# Altium footprint library ref-packages.PCBLIB: 1544 footprints (part 18 of 103)
Each footprint in its own frame and in the unit in brackets; x right, y up, seen from the top. Pads: shape width x height; smd on the part's side, far side on the other; paste and mask are expansions set on the pad; w line width, h text height; cw(c..) or ccw(c..) is an arc to the next point about the centre after c.
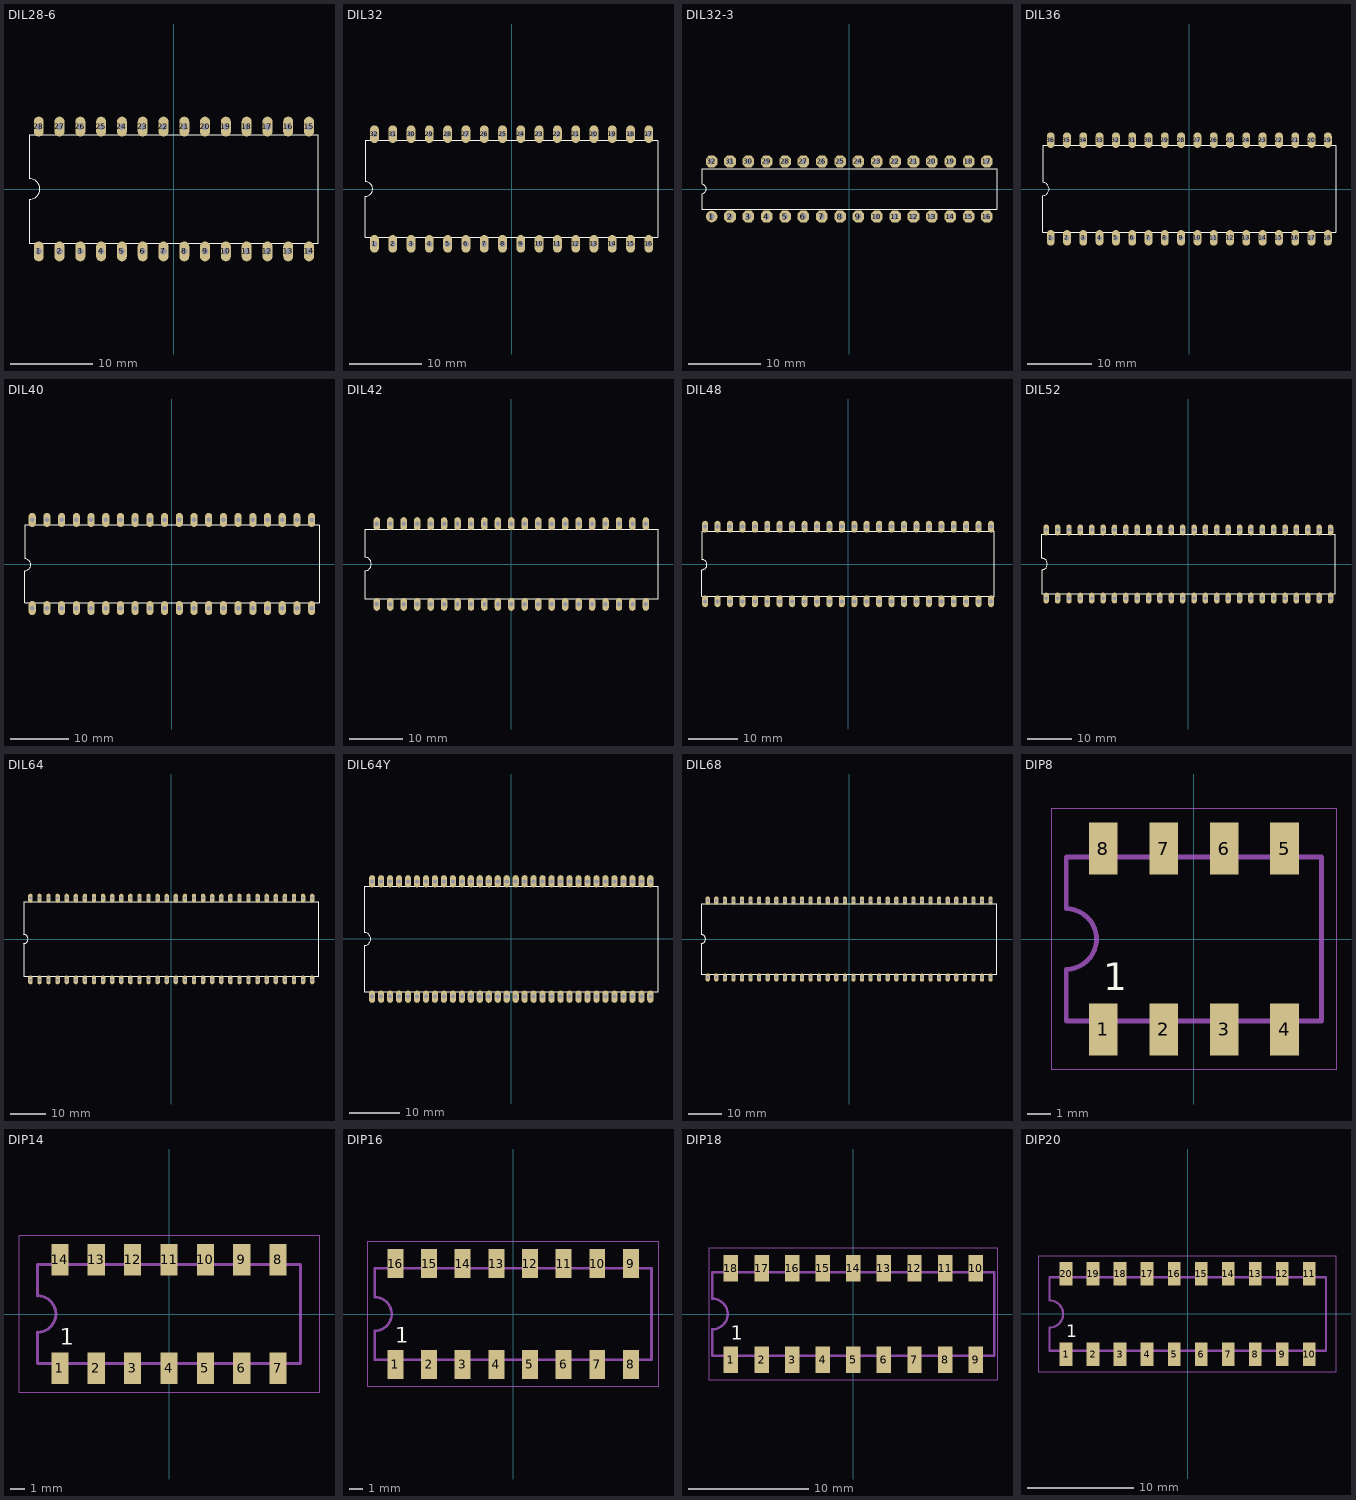
[diagram p17: the footprints below, top view; thin cyan lines are the x and y axes]

## DIL28-6 [mil]
pads (28):
  oval 48x96 hole 32: 1(-650,-300) 2(-550,-300) 3(-450,-300) 4(-350,-300) 5(-250,-300) 6(-150,-300) 7(-50,-300) 8(50,-300) 9(150,-300) 10(250,-300) 11(350,-300) 12(450,-300) 13(550,-300) 14(650,-300) 15(650,300) 16(550,300) 17(450,300) 18(350,300) 19(250,300) 20(150,300) 21(50,300) 22(-50,300) 23(-150,300) 24(-250,300) 25(-350,300) 26(-450,300) 27(-550,300) 28(-650,300)
Top Overlay:
  lines w6: -695,-260 -695,-50 ccw(c-695,0) -695,50 -695,260 695,260 695,-260 -695,-260

## DIL32 [mil]
pads (32):
  oval 48x96 hole 32: 1(-750,-300) 2(-650,-300) 3(-550,-300) 4(-450,-300) 5(-350,-300) 6(-250,-300) 7(-150,-300) 8(-50,-300) 9(50,-300) 10(150,-300) 11(250,-300) 12(350,-300) 13(450,-300) 14(550,-300) 15(650,-300) 16(750,-300) 17(750,300) 18(650,300) 19(550,300) 20(450,300) 21(350,300) 22(250,300) 23(150,300) 24(50,300) 25(-50,300) 26(-150,300) 27(-250,300) 28(-350,300) 29(-450,300) 30(-550,300) 31(-650,300) 32(-750,300)
Top Overlay:
  lines w6: -800,-265 800,-265 800,265 -800,265 -800,40 cw(c-800,0) -800,-40 -800,-265

## DIL32-3 [mil]
pads (32):
  round 63 hole 32: 1(-750,-150)
  oct 63x63 hole 32: 2(-650,-150) 3(-550,-150) 4(-450,-150) 5(-350,-150) 6(-250,-150) 7(-150,-150) 8(-50,-150) 9(50,-150) 10(150,-150) 11(250,-150) 12(350,-150) 13(450,-150) 14(550,-150) 15(650,-150) 16(750,-150) 17(750,150) 18(650,150) 19(550,150) 20(450,150) 21(350,150) 22(250,150) 23(150,150) 24(50,150) 25(-50,150) 26(-150,150) 27(-250,150) 28(-350,150) 29(-450,150) 30(-550,150) 31(-650,150) 32(-750,150)
Top Overlay:
  lines w6: -805,-110 -805,-25 ccw(c-805,0) -805,25 -805,110 805,110 805,-110 -805,-110

## DIL36 [mil]
pads (36):
  oval 48x96 hole 32: 1(-850,-300) 2(-750,-300) 3(-650,-300) 4(-550,-300) 5(-450,-300) 6(-350,-300) 7(-250,-300) 8(-150,-300) 9(-50,-300) 10(50,-300) 11(150,-300) 12(250,-300) 13(350,-300) 14(450,-300) 15(550,-300) 16(650,-300) 17(750,-300) 18(850,-300) 19(850,300) 20(750,300) 21(650,300) 22(550,300) 23(450,300) 24(350,300) 25(250,300) 26(150,300) 27(50,300) 28(-50,300) 29(-150,300) 30(-250,300) 31(-350,300) 32(-450,300) 33(-550,300) 34(-650,300) 35(-750,300) 36(-850,300)
Top Overlay:
  lines w6: -900,-265 900,-265 900,265 -900,265 -900,40 cw(c-900,0) -900,-40 -900,-265

## DIL40 [mil]
pads (40):
  oval 48x96 hole 32: 1(-950,-300) 2(-850,-300) 3(-750,-300) 4(-650,-300) 5(-550,-300) 6(-450,-300) 7(-350,-300) 8(-250,-300) 9(-150,-300) 10(-50,-300) 11(50,-300) 12(150,-300) 13(250,-300) 14(350,-300) 15(450,-300) 16(550,-300) 17(650,-300) 18(750,-300) 19(850,-300) 20(950,-300) 21(950,300) 22(850,300) 23(750,300) 24(650,300) 25(550,300) 26(450,300) 27(350,300) 28(250,300) 29(150,300) 30(50,300) 31(-50,300) 32(-150,300) 33(-250,300) 34(-350,300) 35(-450,300) 36(-550,300) 37(-650,300) 38(-750,300) 39(-850,300) 40(-950,300)
Top Overlay:
  lines w6: -1000,-265 1000,-265 1000,265 -1000,265 -1000,35 cw(c-1000,-5) -1000,-45 -1000,-265

## DIL42 [mil]
pads (42):
  oval 48x96 hole 32: 1(-1000,-300) 2(-900,-300) 3(-800,-300) 4(-700,-300) 5(-600,-300) 6(-500,-300) 7(-400,-300) 8(-300,-300) 9(-200,-300) 10(-100,-300) 11(0,-300) 12(100,-300) 13(200,-300) 14(300,-300) 15(400,-300) 16(500,-300) 17(600,-300) 18(700,-300) 19(800,-300) 20(900,-300) 21(1000,-300) 22(1000,300) 23(900,300) 24(800,300) 25(700,300) 26(600,300) 27(500,300) 28(400,300) 29(300,300) 30(200,300) 31(100,300) 32(0,300) 33(-100,300) 34(-200,300) 35(-300,300) 36(-400,300) 37(-500,300) 38(-600,300) 39(-700,300) 40(-800,300) 41(-900,300) 42(-1000,300)
Top Overlay:
  lines w6: -1090,-260 -1090,-50 ccw(c-1090,0) -1090,50 -1090,260 1090,260 1090,-260 -1090,-260

## DIL48 [mil]
pads (48):
  oval 48x96 hole 32: 1(-1150,-300) 2(-1050,-300) 3(-950,-300) 4(-850,-300) 5(-750,-300) 6(-650,-300) 7(-550,-300) 8(-450,-300) 9(-350,-300) 10(-250,-300) 11(-150,-300) 12(-50,-300) 13(50,-300) 14(150,-300) 15(250,-300) 16(350,-300) 17(450,-300) 18(550,-300) 19(650,-300) 20(750,-300) 21(850,-300) 22(950,-300) 23(1050,-300) 24(1150,-300) 25(1150,300) 26(1050,300) 27(950,300) 28(850,300) 29(750,300) 30(650,300) 31(550,300) 32(450,300) 33(350,300) 34(250,300) 35(150,300) 36(50,300) 37(-50,300) 38(-150,300) 39(-250,300) 40(-350,300) 41(-450,300) 42(-550,300) 43(-650,300) 44(-750,300) 45(-850,300) 46(-950,300) 47(-1050,300) 48(-1150,300)
Top Overlay:
  lines w6: -1175,-260 1175,-260 1175,260 -1175,260 -1175,35 cw(c-1175,-5) -1175,-45 -1175,-260

## DIL52 [mil]
pads (52):
  oval 48x96 hole 32: 1(-1250,-300) 2(-1150,-300) 3(-1050,-300) 4(-950,-300) 5(-850,-300) 6(-750,-300) 7(-650,-300) 8(-550,-300) 9(-450,-300) 10(-350,-300) 11(-250,-300) 12(-150,-300) 13(-50,-300) 14(50,-300) 15(150,-300) 16(250,-300) 17(350,-300) 18(450,-300) 19(550,-300) 20(650,-300) 21(750,-300) 22(850,-300) 23(950,-300) 24(1050,-300) 25(1150,-300) 26(1250,-300) 27(1250,300) 28(1150,300) 29(1050,300) 30(950,300) 31(850,300) 32(750,300) 33(650,300) 34(550,300) 35(450,300) 36(350,300) 37(250,300) 38(150,300) 39(50,300) 40(-50,300) 41(-150,300) 42(-250,300) 43(-350,300) 44(-450,300) 45(-550,300) 46(-650,300) 47(-750,300) 48(-850,300) 49(-950,300) 50(-1050,300) 51(-1150,300) 52(-1250,300)
Top Overlay:
  lines w6: -1290,-260 -1290,-50 ccw(c-1290,0) -1290,50 -1290,260 1290,260 1290,-260 -1290,-260

## DIL64 [mil]
pads (64):
  oval 48x96 hole 32: 1(-1550,-450) 2(-1450,-450) 3(-1350,-450) 4(-1250,-450) 5(-1150,-450) 6(-1050,-450) 7(-950,-450) 8(-850,-450) 9(-750,-450) 10(-650,-450) 11(-550,-450) 12(-450,-450) 13(-350,-450) 14(-250,-450) 15(-150,-450) 16(-50,-450) 17(50,-450) 18(150,-450) 19(250,-450) 20(350,-450) 21(450,-450) 22(550,-450) 23(650,-450) 24(750,-450) 25(850,-450) 26(950,-450) 27(1050,-450) 28(1150,-450) 29(1250,-450) 30(1350,-450) 31(1450,-450) 32(1550,-450) 33(1550,450) 34(1450,450) 35(1350,450) 36(1250,450) 37(1150,450) 38(1050,450) 39(950,450) 40(850,450) 41(750,450) 42(650,450) 43(550,450) 44(450,450) 45(350,450) 46(250,450) 47(150,450) 48(50,450) 49(-50,450) 50(-150,450) 51(-250,450) 52(-350,450) 53(-450,450) 54(-550,450) 55(-650,450) 56(-750,450) 57(-850,450) 58(-950,450) 59(-1050,450) 60(-1150,450) 61(-1250,450) 62(-1350,450) 63(-1450,450) 64(-1550,450)
Top Overlay:
  lines w6: -1625,-410 -1625,-50 ccw(c-1625,0) -1625,50 -1625,410 1625,410 1625,-410 -1625,-410

## DIL64Y [mil]
pads (64):
  oval 48x96 hole 32: 1(-1085,-450) 2(-1015,-450) 3(-945,-450) 4(-875,-450) 5(-805,-450) 6(-735,-450) 7(-665,-450) 8(-595,-450) 9(-525,-450) 10(-455,-450) 11(-385,-450) 12(-315,-450) 13(-245,-450) 14(-175,-450) 15(-105,-450) 16(-35,-450) 17(35,-450) 18(105,-450) 19(175,-450) 20(245,-450) 21(315,-450) 22(385,-450) 23(455,-450) 24(525,-450) 25(595,-450) 26(665,-450) 27(735,-450) 28(805,-450) 29(875,-450) 30(945,-450) 31(1015,-450) 32(1085,-450) 33(1085,450) 34(1015,450) 35(945,450) 36(875,450) 37(805,450) 38(735,450) 39(665,450) 40(595,450) 41(525,450) 42(455,450) 43(385,450) 44(315,450) 45(245,450) 46(175,450) 47(105,450) 48(35,450) 49(-35,450) 50(-105,450) 51(-175,450) 52(-245,450) 53(-315,450) 54(-385,450) 55(-455,450) 56(-525,450) 57(-595,450) 58(-665,450) 59(-735,450) 60(-805,450) 61(-875,450) 62(-945,450) 63(-1015,450) 64(-1085,450)
Top Overlay:
  lines w6: -1145,-410 -1145,-50 ccw(c-1145,0) -1145,50 -1145,410 1145,410 1145,-410 -1145,-410

## DIL68 [mil]
pads (68):
  oval 48x96 hole 32: 1(-1650,-450) 2(-1550,-450) 3(-1450,-450) 4(-1350,-450) 5(-1250,-450) 6(-1150,-450) 7(-1050,-450) 8(-950,-450) 9(-850,-450) 10(-750,-450) 11(-650,-450) 12(-550,-450) 13(-450,-450) 14(-350,-450) 15(-250,-450) 16(-150,-450) 17(-50,-450) 18(50,-450) 19(150,-450) 20(250,-450) 21(350,-450) 22(450,-450) 23(550,-450) 24(650,-450) 25(750,-450) 26(850,-450) 27(950,-450) 28(1050,-450) 29(1150,-450) 30(1250,-450) 31(1350,-450) 32(1450,-450) 33(1550,-450) 34(1650,-450) 35(1650,450) 36(1550,450) 37(1450,450) 38(1350,450) 39(1250,450) 40(1150,450) 41(1050,450) 42(950,450) 43(850,450) 44(750,450) 45(650,450) 46(550,450) 47(450,450) 48(350,450) 49(250,450) 50(150,450) 51(50,450) 52(-50,450) 53(-150,450) 54(-250,450) 55(-350,450) 56(-450,450) 57(-550,450) 58(-650,450) 59(-750,450) 60(-850,450) 61(-950,450) 62(-1050,450) 63(-1150,450) 64(-1250,450) 65(-1350,450) 66(-1450,450) 67(-1550,450) 68(-1650,450)
Top Overlay:
  lines w6: -1725,-410 -1725,-50 ccw(c-1725,0) -1725,50 -1725,410 1725,410 1725,-410 -1725,-410

## DIP8 [mil]
pads (8):
  rect 47.24x86.61 smd: 1(-150,-149.61) 2(-50,-149.61) 3(50,-149.61) 4(150,-149.61) 5(150,149.61) 6(50,149.61) 7(-50,149.61) 8(-150,149.61)
Top Overlay:
  text "1" at -150,-100 h77.5
Mechanical 16:
  rectangle: -161.02,-162.2 -138.98,-135.83
  rectangle: -61.02,-162.2 -38.98,-135.83
  rectangle: 38.98,-162.2 61.02,-135.83
  rectangle: 138.98,-162.2 161.02,-135.83
  rectangle: 138.98,135.83 161.02,162.2
  rectangle: 38.98,135.83 61.02,162.2
  rectangle: -61.02,135.83 -38.98,162.2
  rectangle: -161.02,135.83 -138.98,162.2
  lines w8: -211.02,-135.83 211.02,-135.83 211.02,135.83 -211.02,135.83 -211.02,50 cw(c-211.02,0) -211.02,-50 -211.02,-135.83
Mechanical 27:
  lines w2: -235.16,-215.87 235.16,-215.87 235.16,215.87 -235.16,215.87 -235.16,-215.87

## DIP14 [mil]
pads (14):
  rect 47.24x86.61 smd: 1(-300,-149.61) 2(-200,-149.61) 3(-100,-149.61) 4(0,-149.61) 5(100,-149.61) 6(200,-149.61) 7(300,-149.61) 8(300,149.61) 9(200,149.61) 10(100,149.61) 11(0,149.61) 12(-100,149.61) 13(-200,149.61) 14(-300,149.61)
Top Overlay:
  text "1" at -300,-100 h77.5
Mechanical 16:
  rectangle: -311.02,-162.2 -288.98,-135.83
  rectangle: -211.02,-162.2 -188.98,-135.83
  rectangle: -111.02,-162.2 -88.98,-135.83
  rectangle: -11.02,-162.2 11.02,-135.83
  rectangle: 88.98,-162.2 111.02,-135.83
  rectangle: 188.98,-162.2 211.02,-135.83
  rectangle: 288.98,-162.2 311.02,-135.83
  rectangle: 288.98,135.83 311.02,162.2
  rectangle: 188.98,135.83 211.02,162.2
  rectangle: 88.98,135.83 111.02,162.2
  rectangle: -11.02,135.83 11.02,162.2
  rectangle: -111.02,135.83 -88.98,162.2
  rectangle: -211.02,135.83 -188.98,162.2
  rectangle: -311.02,135.83 -288.98,162.2
  lines w8: -361.22,-50.2 ccw(c-361.22,0) -361.22,50.2 ; -361.02,-50 -361.02,-135.83 361.02,-135.83 361.02,135.83 -361.02,135.83 -361.02,50
Mechanical 27:
  lines w2: -412.32,-215.87 412.32,-215.87 412.32,215.87 -412.32,215.87 -412.32,-215.87

## DIP16 [mil]
pads (16):
  rect 47.24x86.61 smd: 1(-350,-149.61) 2(-250,-149.61) 3(-150,-149.61) 4(-50,-149.61) 5(50,-149.61) 6(150,-149.61) 7(250,-149.61) 8(350,-149.61) 9(350,149.61) 10(250,149.61) 11(150,149.61) 12(50,149.61) 13(-50,149.61) 14(-150,149.61) 15(-250,149.61) 16(-350,149.61)
Top Overlay:
  text "1" at -350,-100 h77.5
Mechanical 16:
  rectangle: -361.02,-162.2 -338.98,-135.83
  rectangle: -261.02,-162.2 -238.98,-135.83
  rectangle: -161.02,-162.2 -138.98,-135.83
  rectangle: -61.02,-162.2 -38.98,-135.83
  rectangle: 38.98,-162.2 61.02,-135.83
  rectangle: 138.98,-162.2 161.02,-135.83
  rectangle: 238.98,-162.2 261.02,-135.83
  rectangle: 338.98,-162.2 361.02,-135.83
  rectangle: 338.98,135.83 361.02,162.2
  rectangle: 238.98,135.83 261.02,162.2
  rectangle: 138.98,135.83 161.02,162.2
  rectangle: 38.98,135.83 61.02,162.2
  rectangle: -61.02,135.83 -38.98,162.2
  rectangle: -161.02,135.83 -138.98,162.2
  rectangle: -261.02,135.83 -238.98,162.2
  rectangle: -361.02,135.83 -338.98,162.2
  lines w8: -411.02,-135.83 411.02,-135.83 411.02,135.83 -411.02,135.83 -411.02,50 cw(c-411.02,0) -411.02,-50 -411.02,-135.83
Mechanical 27:
  lines w2: -432.01,-215.87 430.43,-215.87 430.43,215.87 -432.01,215.87 -432.01,-215.87

## DIP18 [mil]
pads (18):
  rect 47.24x86.61 smd: 1(-400,-149.61) 2(-300,-149.61) 3(-200,-149.61) 4(-100,-149.61) 5(0,-149.61) 6(100,-149.61) 7(200,-149.61) 8(300,-149.61) 9(400,-149.61) 10(400,149.61) 11(300,149.61) 12(200,149.61) 13(100,149.61) 14(0,149.61) 15(-100,149.61) 16(-200,149.61) 17(-300,149.61) 18(-400,149.61)
Top Overlay:
  text "1" at -400,-100 h77.5
Mechanical 16:
  rectangle: -411.02,-162.2 -388.98,-135.83
  rectangle: -311.02,-162.2 -288.98,-135.83
  rectangle: -211.02,-162.2 -188.98,-135.83
  rectangle: -111.02,-162.2 -88.98,-135.83
  rectangle: -11.02,-162.2 11.02,-135.83
  rectangle: 88.98,-162.2 111.02,-135.83
  rectangle: 188.98,-162.2 211.02,-135.83
  rectangle: 288.98,-162.2 311.02,-135.83
  rectangle: 388.98,-162.2 411.02,-135.83
  rectangle: 388.98,135.83 411.02,162.2
  rectangle: 288.98,135.83 311.02,162.2
  rectangle: 188.98,135.83 211.02,162.2
  rectangle: 88.98,135.83 111.02,162.2
  rectangle: -11.02,135.83 11.02,162.2
  rectangle: -111.02,135.83 -88.98,162.2
  rectangle: -211.02,135.83 -188.98,162.2
  rectangle: -311.02,135.83 -288.98,162.2
  rectangle: -411.02,135.83 -388.98,162.2
  lines w8: -461.02,-135.83 461.02,-135.83 461.02,135.83 -461.02,135.83 -461.02,50 cw(c-461.02,0) -461.02,-50 -461.02,-135.83
Mechanical 27:
  lines w2: -471.38,-215.87 469.8,-215.87 469.8,215.87 -471.38,215.87 -471.38,-215.87

## DIP20 [mil]
pads (20):
  rect 47.24x86.61 smd: 1(-450,-149.61) 2(-350,-149.61) 3(-250,-149.61) 4(-150,-149.61) 5(-50,-149.61) 6(50,-149.61) 7(150,-149.61) 8(250,-149.61) 9(350,-149.61) 10(450,-149.61) 11(450,149.61) 12(350,149.61) 13(250,149.61) 14(150,149.61) 15(50,149.61) 16(-50,149.61) 17(-150,149.61) 18(-250,149.61) 19(-350,149.61) 20(-450,149.61)
Top Overlay:
  text "1" at -450,-100 h77.5
Mechanical 16:
  rectangle: -461.02,-162.2 -438.98,-135.83
  rectangle: -361.02,-162.2 -338.98,-135.83
  rectangle: -261.02,-162.2 -238.98,-135.83
  rectangle: -161.02,-162.2 -138.98,-135.83
  rectangle: -61.02,-162.2 -38.98,-135.83
  rectangle: 38.98,-162.2 61.02,-135.83
  rectangle: 138.98,-162.2 161.02,-135.83
  rectangle: 238.98,-162.2 261.02,-135.83
  rectangle: 338.98,-162.2 361.02,-135.83
  rectangle: 438.98,-162.2 461.02,-135.83
  rectangle: 438.98,135.83 461.02,162.2
  rectangle: 338.98,135.83 361.02,162.2
  rectangle: 238.98,135.83 261.02,162.2
  rectangle: 138.98,135.83 161.02,162.2
  rectangle: 38.98,135.83 61.02,162.2
  rectangle: -61.02,135.83 -38.98,162.2
  rectangle: -161.02,135.83 -138.98,162.2
  rectangle: -261.02,135.83 -238.98,162.2
  rectangle: -361.02,135.83 -338.98,162.2
  rectangle: -461.02,135.83 -438.98,162.2
  lines w8: -511.02,-50 -511.02,-135.83 511.02,-135.83 511.02,135.83 -511.02,135.83 -511.02,50 ; -510.83,-50.2 ccw(c-510.83,0) -510.83,50.2
Mechanical 27:
  lines w2: -550.12,-215.87 548.54,-215.87 548.54,215.87 -550.12,215.87 -550.12,-215.87